# Altium footprint library lib_protel_HC.PCBLIB: 724 footprints (part 28 of 46)
Each footprint in its own frame and in the unit in brackets; x right, y up, seen from the top. Pads: shape width x height; smd on the part's side, far side on the other; paste and mask are expansions set on the pad; w line width, h text height; cw(c..) or ccw(c..) is an arc to the next point about the centre after c.
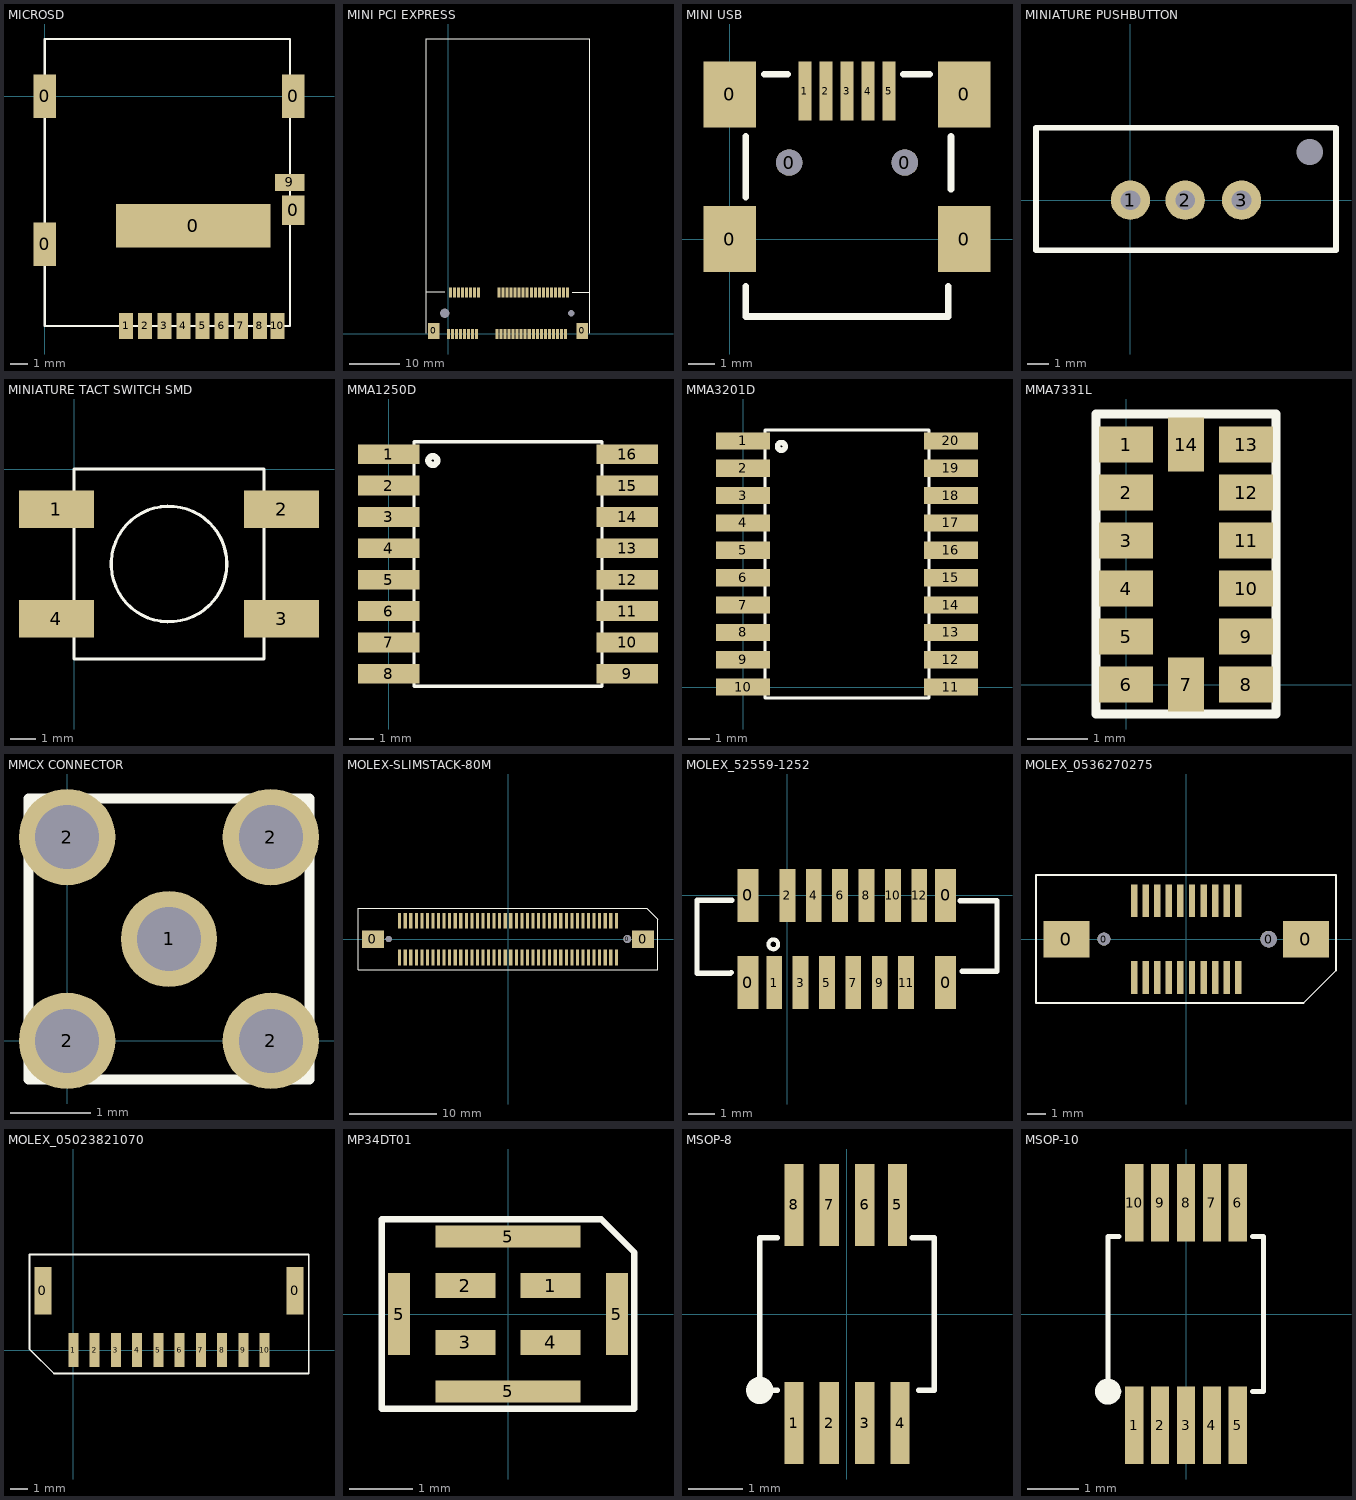
[diagram p27: the footprints below, top view; thin cyan lines are the x and y axes]

## MICROSD [mm] "LECTOR TARJETAS MICROSD FLASH"
height 1.6
pads (15):
  rect 1.3x2.5 smd: 0(0,-8.5) 0(0,0) 0(14.3,0)
  rect 8.9x2.5 smd: 0(8.55,-7.45)
  rect 1.3x1.7 smd: 0(14.3,-6.55)
  rect 0.8x1.5 smd: 1(4.68,-13.2) 2(5.78,-13.2) 3(6.88,-13.2) 4(7.98,-13.2) 5(9.08,-13.2) 6(10.18,-13.2) 7(11.28,-13.2) 8(12.38,-13.2) 10(13.38,-13.2)
  rect 1.7x1 smd: 9(14.1,-4.95)
Top Overlay:
  lines w0.127: 14.09,3.3 0,3.3 0,-13.2 14.1,-13.2 14.1,3.3

## MINI PCI EXPRESS [mm] "MINI PCI EXPRESS CARD"
height 4
pads (56):
  rect 2.3x3.2 smd mask+0.05: 0(-2.85,0.6) 0(26.45,0.6)
  rect 0x0 hole 1.8 mask+0.05: 0(-0.7,4.1)
  rect 0x0 hole 1.3 mask+0.05: 0(24.3,4.1)
  rect 0.6x2 smd mask+0.05: 1(0,0) 2(0.4,8.2) 3(0.8,0) 4(1.2,8.2) 5(1.6,0) 6(2,8.2) 7(2.4,0) 8(2.8,8.2) 9(3.2,0) 10(3.6,8.2) 11(4,0) 12(4.4,8.2) 13(4.8,0) 14(5.2,8.2) 15(5.6,0) 16(6,8.2) 17(9.6,0) 18(10,8.2) 19(10.4,0) 20(10.8,8.2) 21(11.2,0) 22(11.6,8.2) 23(12,0) 24(12.4,8.2) 25(12.8,0) 26(13.2,8.2) 27(13.6,0) 28(14,8.2) 29(14.4,0) 30(14.8,8.2) 31(15.2,0) 32(15.6,8.2) 33(16,0) 34(16.4,8.2) 35(16.8,0) 36(17.2,8.2) 37(17.6,0) 38(18,8.2) 39(18.4,0) 40(18.8,8.2) 41(19.2,0) 42(19.6,8.2) 43(20,0) 44(20.4,8.2) 45(20.8,0) 46(21.2,8.2) 47(21.6,0) 48(22,8.2) 49(22.4,0) 50(22.8,8.2) 51(23.2,0) 52(23.6,8.2)
Top Overlay:
  lines w0.1: -4.4,0.1 -4.4,8.3 ; -0.7,8.3 -4.4,8.3 ; 24.5,8.2 28,8.2 ; 28,0.1 28,8.2 ; -4.4,8.3 -4.4,58.3 28,58.3 28,8.2

## MINI USB [mm]
height 4
pads (11):
  rect 2x2.5 smd: 0(0,0) 0(0,5.5) 0(8.9,0) 0(8.9,5.5)
  round 1 hole 1: 0(2.25,2.91) 0(6.65,2.91)
  rect 0.5x2.25 smd: 1(2.85,5.625) 2(3.65,5.625) 3(4.45,5.625) 4(5.25,5.625) 5(6.05,5.625)
Top Overlay:
  lines w0.254: 0.6,-1.8 0.6,-2.94 8.3,-2.94 8.3,-1.8 ; 0.6,1.6 0.6,3.9 ; 1.3,6.26 2.2,6.26 ; 6.6,6.26 7.6,6.26 ; 8.4,1.9 8.4,3.9

## MINIATURE PUSHBUTTON [mm] "interruptor horizontal miniatura"
height 8.3
pads (4):
  round 0 on Top hole 1.2: 0(8.2,2.2)
  round 1.8 hole 0.9: 1(0,0) 2(2.5,0) 3(5.08,0)
Top Overlay:
  lines w0.254: -4.318,-2.286 -4.318,3.302 9.398,3.302 9.398,-2.032 9.398,-2.286 -4.318,-2.286

## MINIATURE TACT SWITCH SMD [mm]
pads (4):
  rect 3x1.5 smd: 1(-0.7,-1.595) 2(8.3,-1.595) 3(8.3,-5.995) 4(-0.7,-5.995)
Top Overlay:
  circle w0.127: c3.8,-3.795 r2.311
  lines w0.127: 0,-7.595 0,0.005 7.6,0.005 7.6,-7.595 0,-7.595

## MMA1250D [mm] "ACELERÓMETRO Z 5g"
pads (16):
  rect 2.5x0.8 smd: 1(0,11.43) 2(0,10.16) 3(0,8.89) 4(0,7.62) 5(0,6.35) 6(0,5.08) 7(0,3.81) 8(0,2.54) 9(9.652,2.54) 10(9.652,3.81) 11(9.652,5.08) 12(9.652,6.35) 13(9.652,7.62) 14(9.652,8.89) 15(9.652,10.16) 16(9.652,11.43)
Top Overlay:
  circle w0.254: c1.778,11.176 r0.18
  lines w0.127: 1.016,2.032 1.016,11.938 8.636,11.938 8.636,2.032 1.016,2.032

## MMA3201D [mm] "ACELERÓMETRO X-Y 40g"
pads (20):
  rect 2.5x0.8 smd: 1(0,11.43) 2(0,10.16) 3(0,8.89) 4(0,7.62) 5(0,6.35) 6(0,5.08) 7(0,3.81) 8(0,2.54) 9(0,1.27) 10(0,0) 11(9.652,0) 12(9.652,1.27) 13(9.652,2.54) 14(9.652,3.81) 15(9.652,5.08) 16(9.652,6.35) 17(9.652,7.62) 18(9.652,8.89) 19(9.652,10.16) 20(9.652,11.43)
Top Overlay:
  circle w0.254: c1.778,11.176 r0.18
  lines w0.127: 1.016,-0.508 8.636,-0.508 8.636,11.938 1.016,11.938 1.016,-0.508

## MMA7331L [mm] "ACELERÓMETRO 3 EJES MMA7331L"
height 1
pads (14):
  rect 0.9x0.6 smd: 1(0,4) 2(0,3.2) 3(0,2.4) 4(0,1.6) 5(0,0.8) 6(0,0) 8(2,0) 9(2,0.8) 10(2,1.6) 11(2,2.4) 12(2,3.2) 13(2,4)
  rect 0.6x0.9 smd: 7(1,0) 14(1,4)
Top Overlay:
  lines w0.152: -0.5,-0.49 -0.5,4.51 2.5,4.51 2.5,-0.49 -0.5,-0.49

## MMCX CONNECTOR [mm]
pads (5):
  round 1.2 on Top hole 0.8: 1(1.27,1.27) 2(0,0) 2(0,2.54) 2(2.54,0) 2(2.54,2.54)
Top Overlay:
  lines w0.127: -0.48,-0.48 -0.48,3.02 3.02,3.02 3.02,-0.48 -0.48,-0.48

## MOLEX-SLIMSTACK-80M [mm]
height 4.44
pads (84):
  rect 2.5x2 smd: 0(-15.435,0) 0(15.435,0)
  round 0.705 hole 0.7 unplated: 0(-13.635,0)
  round 0.905 hole 0.9: 0(13.635,0)
  rect 0.35x1.8 smd: 1(12.383,2.1) 2(12.383,-2.1) 3(11.747,2.1) 4(11.747,-2.1) 5(11.112,2.1) 6(11.112,-2.1) 7(10.477,2.1) 8(10.477,-2.1) 9(9.842,2.1) 10(9.842,-2.1) 11(9.207,2.1) 12(9.207,-2.1) 13(8.572,2.1) 14(8.572,-2.1) 15(7.938,2.1) 16(7.938,-2.1) 17(7.302,2.1) 18(7.302,-2.1) 19(6.667,2.1) 20(6.667,-2.1) 21(6.032,2.1) 22(6.032,-2.1) 23(5.397,2.1) 24(5.397,-2.1) 25(4.763,2.1) 26(4.763,-2.1) 27(4.127,2.1) 28(4.127,-2.1) 29(3.492,2.1) 30(3.492,-2.1) 31(2.857,2.1) 32(2.857,-2.1) 33(2.222,2.1) 34(2.222,-2.1) 35(1.587,2.1) 36(1.587,-2.1) 37(0.953,2.1) 38(0.953,-2.1) 39(0.318,2.1) 40(0.318,-2.1) 41(-0.318,2.1) 42(-0.318,-2.1) 43(-0.953,2.1) 44(-0.953,-2.1) 45(-1.587,2.1) 46(-1.587,-2.1) 47(-2.222,2.1) 48(-2.222,-2.1) 49(-2.857,2.1) 50(-2.857,-2.1) 51(-3.492,2.1) 52(-3.492,-2.1) 53(-4.127,2.1) 54(-4.127,-2.1) 55(-4.763,2.1) 56(-4.763,-2.1) 57(-5.397,2.1) 58(-5.397,-2.1) 59(-6.032,2.1) 60(-6.032,-2.1) 61(-6.667,2.1) 62(-6.667,-2.1) 63(-7.302,2.1) 64(-7.302,-2.1) 65(-7.938,2.1) 66(-7.938,-2.1) 67(-8.572,2.1) 68(-8.572,-2.1) 69(-9.207,2.1) 70(-9.207,-2.1) 71(-9.842,2.1) 72(-9.842,-2.1) 73(-10.477,2.1) 74(-10.477,-2.1) 75(-11.112,2.1) 76(-11.112,-2.1) 77(-11.747,2.1) 78(-11.747,-2.1) 79(-12.383,2.1) 80(-12.383,-2.1)
Top Overlay:
  lines w0.1: -17.145,-3.5 -17.145,3.51 15.87,3.51 17.145,2.235 17.145,-3.5 -17.145,-3.5
Mechanical 16:
  text "1" at 12.294,3.937 h1.02
  text "79" at -13.005,3.861 h1.02
  text "2" at 12.395,-4.775 h1.02
  text "80" at -13.183,-4.851 h1.02

## MOLEX_52559-1252 [mm] "12 PIN MOLEX SMT"
height 5.3
pads (16):
  rect 0.8x2 smd: 0(-1.5,-3.3) 0(-1.5,0) 0(6,-3.3) 0(6,0)
  rect 0.6x2 smd: 1(-0.5,-3.3) 2(0,0) 3(0.5,-3.3) 4(1,0) 5(1.5,-3.3) 6(2,0) 7(2.5,-3.3) 8(3,0) 9(3.5,-3.3) 10(4,0) 11(4.5,-3.3) 12(5,0)
Top Overlay:
  circle w0.152: c-0.533,-1.854 r0.185
  lines w0.2: -2.134,-2.921 -2.159,-2.946 -3.429,-2.946 -3.429,-0.178 -2.108,-0.178 ; 6.553,-0.203 7.95,-0.203 7.95,-2.87 6.629,-2.87

## MOLEX_0536270275 [mm] "20 PIN MOLEX SMT"
height 9
pads (24):
  rect 2.5x2 smd: 0(-6.56,0) 0(6.56,0)
  round 0.705 hole 0.7 unplated: 0(-4.51,0)
  round 0.905 hole 0.9: 0(4.51,0)
  rect 0.35x1.8 smd: 1(2.857,2.1) 2(2.857,-2.1) 3(2.222,2.1) 4(2.222,-2.1) 5(1.587,2.1) 6(1.587,-2.1) 7(0.953,2.1) 8(0.953,-2.1) 9(0.318,2.1) 10(0.318,-2.1) 11(-0.318,2.1) 12(-0.318,-2.1) 13(-0.953,2.1) 14(-0.953,-2.1) 15(-1.587,2.1) 16(-1.587,-2.1) 17(-2.222,2.1) 18(-2.222,-2.1) 19(-2.857,2.1) 20(-2.857,-2.1)
Top Overlay:
  lines w0.1: -8.23,-3.5 6.425,-3.5 8.204,-1.721 8.204,3.51 -8.23,3.51 -8.23,-3.5

## MOLEX_05023821070 [mm] "10 PIN MOLEX SMT"
height 5.45
pads (12):
  rect 1x2.8 smd: 0(-1.8,3.5) 0(13.05,3.5)
  rect 0.6x2 smd: 1(0,0) 2(1.25,0) 3(2.5,0) 4(3.75,0) 5(5,0) 6(6.25,0) 7(7.5,0) 8(8.75,0) 9(10,0) 10(11.25,0)
Top Overlay:
  lines w0.1: -2.579,0.064 -2.579,5.635 13.855,5.635 13.855,-1.375 -1.14,-1.375 -2.579,0.064

## MP34DT01 [mm] "MICROFONO"
height 1
pads (8):
  rect 0.95x0.4 smd mask+0.05: 1(0.675,0.45) 2(-0.675,0.45) 3(-0.675,-0.45) 4(0.675,-0.45)
  rect 0.35x1.3 smd mask+0.05: 5(-1.725,0) 5(1.725,0)
  rect 2.3x0.35 smd mask+0.05: 5(0,-1.225) 5(0,1.225)
Top Overlay:
  lines w0.1: -2,-1.5 -2,1.5 1.475,1.5 2,0.975 2,-1.5 -1.975,-1.5 -2,-1.475
3D body "Micrófono.STEP": height 1, standoff 0, extent -2,-1.5 2,1.5

## MSOP-8 [mm]
pads (8):
  rect 0.35x1.5 smd mask+0.1: 1(-0.975,-2) 2(-0.325,-2) 3(0.325,-2) 4(0.975,-2) 5(0.925,2) 6(0.325,2) 7(-0.325,2) 8(-0.975,2)
Top Overlay:
  circle w0.3: c-1.6,-1.4 r0.1
  lines w0.1: -1.275,-1.4 -1.6,-1.4 -1.6,1.4 -1.275,1.4 ; 1.2,1.4 1.6,1.4 1.6,-1.4 1.317,-1.4

## MSOP-10 [mm]
pads (10):
  rect 0.35x1.5 smd mask+0.1: 1(-1,-2.15) 2(-0.5,-2.15) 3(0,-2.15) 4(0.5,-2.15) 5(1,-2.15) 6(1,2.15) 7(0.5,2.15) 8(0,2.15) 9(-0.5,2.15) 10(-1,2.15)
Top Overlay:
  circle w0.3: c-1.508,-1.5 r0.1
  lines w0.1: -1.3,-1.5 -1.508,-1.5 -1.508,1.5 -1.3,1.5 ; 1.292,-1.5 1.5,-1.5 1.5,1.5 1.292,1.5